# Altium footprint library AltiumLibraries.PcbLib: 247 footprints (part 6 of 16)
Each footprint in its own frame and in the unit in brackets; x right, y up, seen from the top. Pads: shape width x height; smd on the part's side, far side on the other; paste and mask are expansions set on the pad; w line width, h text height; cw(c..) or ccw(c..) is an arc to the next point about the centre after c.
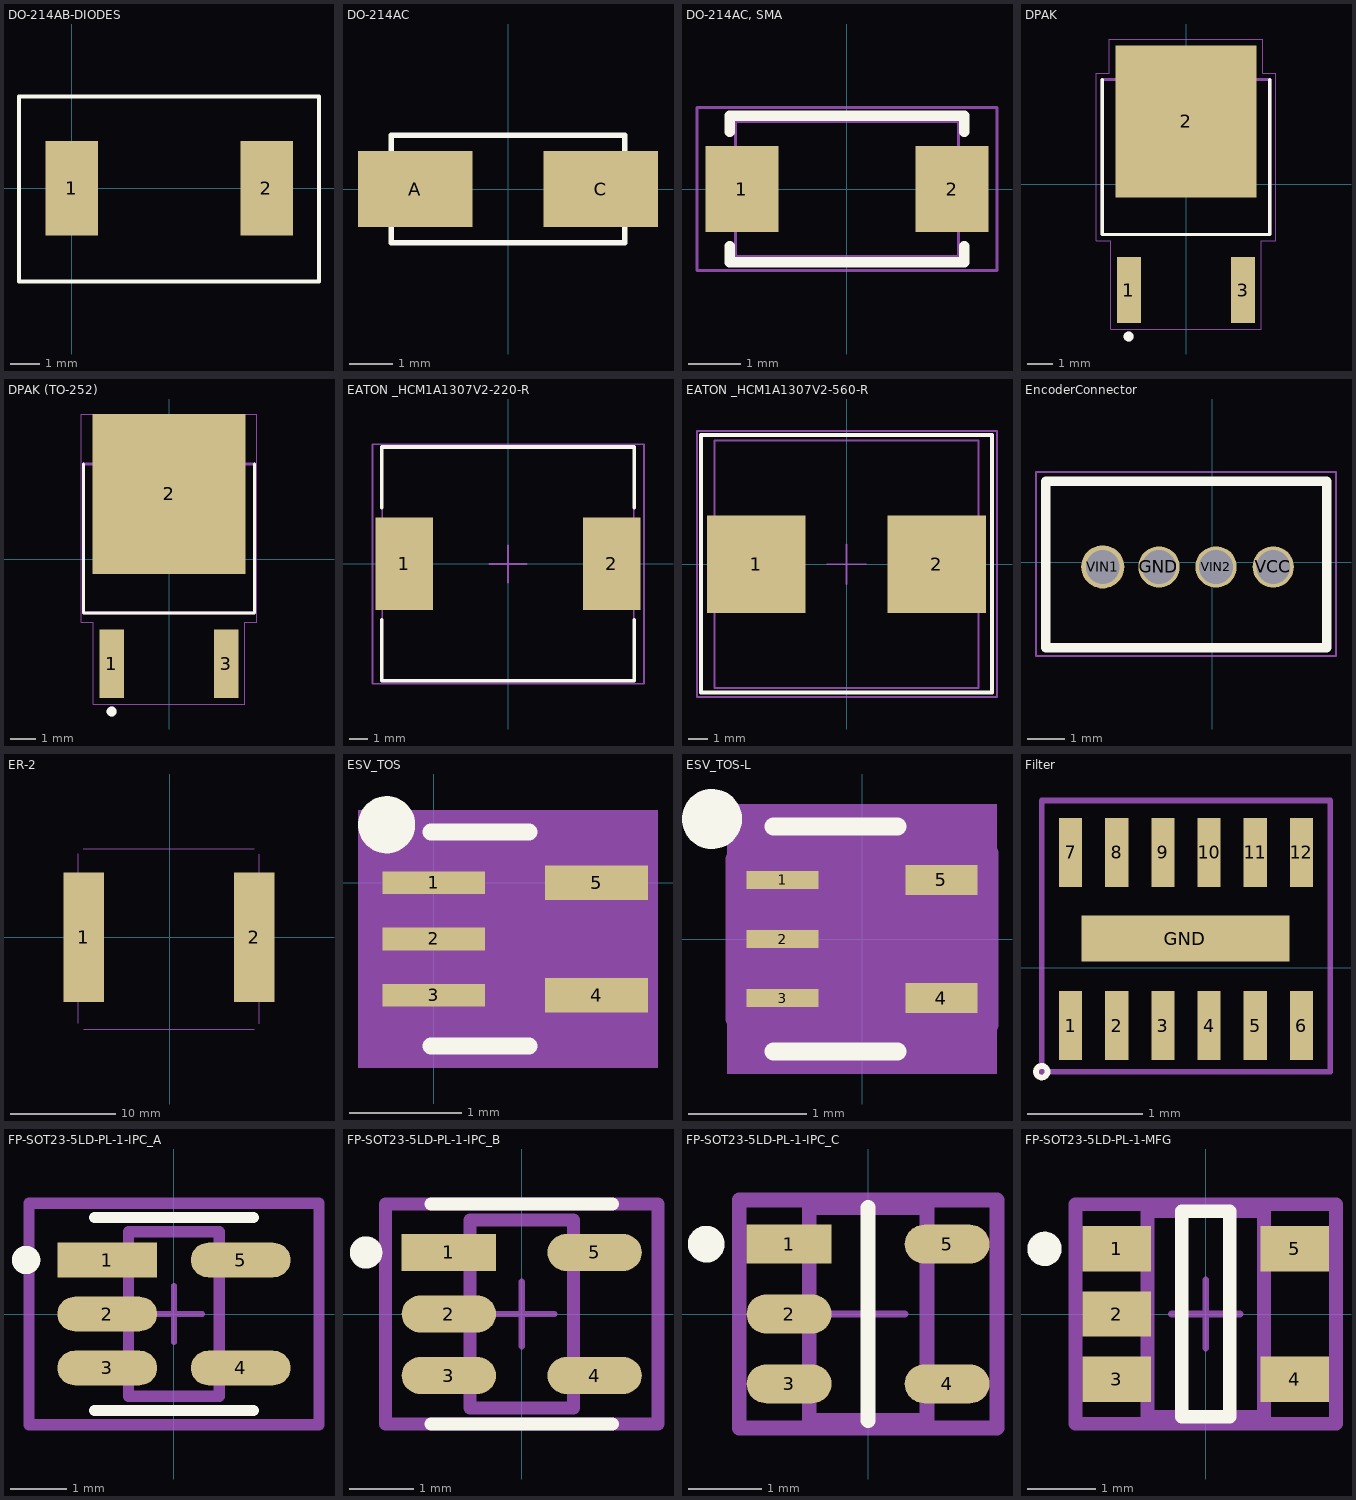
[diagram p5: the footprints below, top view; thin cyan lines are the x and y axes]

## DO-214AB-DIODES [mil]
pads (2):
  rect 70x125.98 smd: 1(0,0) 2(260,0)
Top Overlay:
  lines w5: -70,-124.48 30,-124.48 230,-124.48 330,-124.48 330,-97.98 330,122.52 -70,122.52 -70,-100.94 -70,-124.48
3D body "DO-214AB.SLDPRT": height 110.04, standoff -5.41, extent -28.54,-124.02 288.39,122.05

## DO-214AC [mm]
pads (2):
  rect 2.65x1.75 smd: A(-2.15,0) C(2.15,0)
Top Overlay:
  lines w0.127: -2.7,-1.25 2.7,-1.25 2.7,1.25 -2.7,1.25 -2.7,-1.25

## DO-214AC, SMA [mm]
pads (2):
  rect 1.4x1.64 smd: 1(-2.015,0) 2(2.015,0)
Top Overlay:
  lines w0.2: -2.25,-1.1 -2.25,-1.4 2.25,-1.4 2.25,-1.1 ; -2.25,1.1 -2.25,1.4 2.25,1.4 2.25,1.1
Mechanical 13:
  lines w0.05: -2.138,-1.288 2.138,-1.288 2.138,1.288 -2.138,1.288 -2.138,-1.288
Mechanical 15:
  lines w0.05: -2.875,-1.563 2.875,-1.563 2.875,1.563 -2.875,1.563 -2.875,-1.563
3D body "DIOM4326X23N.step": height 2.3, standoff 0, extent -2.36,-1.29 2.36,1.29

## DPAK [mm]
pads (3):
  rect 0.95x2.64 smd: 1(-2.286,-4.24) 3(2.286,-4.24)
  rect 5.63x6.09 smd: 2(0,2.51)
Top Overlay:
  circle w0.2: c-2.3,-6.1 r0.1
  lines w0.127: -3.35,4.185 -3.35,-2.015 3.35,-2.015 3.35,4.185
Bottom Overlay:
  lines w0.127: 3.35,-2.015 3.35,4.185
Top Paste:
  region: 1.225,3.24 2.535,3.24 2.535,1.78 1.225,1.78
  region: 1.225,5.27 2.535,5.27 2.535,3.81 1.225,3.81
  region: 1.225,1.21 2.535,1.21 2.535,-0.25 1.225,-0.25
  region: -2.535,1.21 -1.225,1.21 -1.225,-0.25 -2.535,-0.25
  region: -2.535,3.24 -1.225,3.24 -1.225,1.78 -2.535,1.78
  region: -2.535,5.27 -1.225,5.27 -1.225,3.81 -2.535,3.81
  region: -0.655,1.21 0.655,1.21 0.655,-0.25 -0.655,-0.25
  region: -0.655,5.27 0.655,5.27 0.655,3.81 -0.655,3.81
  region: -0.655,3.24 0.655,3.24 0.655,1.78 -0.655,1.78
Mechanical 4:
  circle w0.2: c-2.3,-6.1 r0.1
  circle w0.2: c-2.3,-6.1 r0.1
  lines w0.127: -3.35,-2.015 -3.35,4.185 ; -3.35,-2.015 3.35,-2.015 ; -3.35,-2.015 -3.35,4.185 ; -3.35,-2.015 3.35,-2.015 ; -3.35,4.185 3.35,4.185 ; -3.35,4.185 3.35,4.185 ; 3.35,-2.015 3.35,4.185 ; 3.35,-2.015 3.35,4.185
Mechanical 15:
  lines w0.05: -3.6,-2.27 -3.02,-2.27 -3.02,-5.81 3.02,-5.81 3.02,-2.27 3.6,-2.27 3.6,4.44 3.065,4.44 3.065,5.81 -3.065,5.81 -3.065,4.44 -3.6,4.44 -3.6,-2.27

## DPAK (TO-252) [mm]
pads (3):
  rect 0.98x2.74 smd: 1(-2.286,-4.191) 3(2.286,-4.191)
  rect 6.138x6.4 smd paste-4: 2(0,2.616)
Top Overlay:
  circle w0.2: c-2.3,-6.1 r0.1
  lines w0.127: -3.429,3.81 -3.429,-2.159 3.429,-2.159 3.429,3.81
Top Paste:
  region: -0.53,3.15 -2.29,3.15 -2.29,5.03 -0.53,5.03
  region: 2.29,3.15 0.53,3.15 0.53,5.03 2.29,5.03
  region: -0.53,0.21 -2.29,0.21 -2.29,2.09 -0.53,2.09
  region: 2.29,0.21 0.53,0.21 0.53,2.09 2.29,2.09
Mechanical 13:
  circle w0.2: c-2.3,-6.1 r0.1
  lines w0.127: -3.429,3.81 3.429,3.81 ; -3.429,3.825 -3.429,-2.159 3.429,-2.159 3.429,3.825
Mechanical 15:
  lines w0.05: -3.52,-2.52 -3.52,5.8 3.52,5.8 3.52,-2.52 3.026,-2.52 3.026,-5.8 -3.026,-5.8 -3.026,-2.52 -3.52,-2.52
3D body "DPAK.STEP": height 2.46, standoff -0.05, extent -3.25,-4.711 3.25,5.195

## EATON _HCM1A1307V2-220-R [mm] "FIXED IND 22UH 6A 33.1 mOHM SMD"
pads (2):
  rect 3.1x4.95 smd: 1(-5.55,0) 2(5.55,0)
Top Layer:
  lines w0.254: -4.6,-0.4 -4.6,0
Top Overlay:
  lines w0.2: -6.75,-3 -6.75,-6.25 6.75,-6.25 6.75,-3 ; -6.75,3 -6.75,6.25 6.75,6.25 6.75,3
Mechanical 13:
  lines w0.1: -6.73,-6.3 -6.73,6.3 6.73,6.3 6.73,-6.3 -6.73,-6.3
Mechanical 15:
  lines w0.1: -1,0 1,0 ; 0,-1 0,1 ; -7.25,-6.409 -7.25,6.401 7.267,6.401 7.267,-6.409 -7.25,-6.409
3D body "HCM1A1307V2-560-R.STEP": height 6.4, standoff -0.1, extent -6.725,-6.3 6.725,6.3

## EATON _HCM1A1307V2-560-R [mm] "FIXED IND 56UH 4A 65 mOHM SMD"
pads (2):
  rect 5x4.95 smd: 1(-4.6,0) 2(4.6,0)
Top Layer:
  lines w0.254: -4.6,-0.4 -4.6,0
Top Overlay:
  lines w0.2: -7.417,-6.528 -7.417,6.579 7.417,6.579 7.417,-6.528 -7.417,-6.528
Mechanical 13:
  lines w0.1: -6.73,-6.3 -6.73,6.3 6.73,6.3 6.73,-6.3 -6.73,-6.3
Mechanical 15:
  lines w0.1: -1,0 1,0 ; 0,-1 0,1 ; -7.62,-6.756 -7.62,6.782 7.671,6.782 7.671,-6.756 -7.62,-6.756
3D body "HCM1A1307V2-560-R.STEP": height 6.4, standoff -0.1, extent -6.725,-6.3 6.725,6.3

## EncoderConnector [mm] "CONN HEADER R/A 4POS 1.5MM"
pads (4):
  round 1.1 hole 0.9: GND(-1.421,-0.127) VCC(1.627,-0.127) VIN2(0.103,-0.127)
  round 1.15 hole 0.9: VIN1(-2.921,-0.127)
Top Overlay:
  lines w0.254: 3.048,-2.286 3.048,2.159 ; 3.055,-2.286 -4.445,-2.286 -4.445,2.159 3.055,2.159
Mechanical 15:
  lines w0.05: -4.7,-2.5 -4.7,2.4 3.3,2.4 3.3,-2.5 -4.7,-2.5

## ER-2 [mm]
pads (2):
  rect 3.825x12.32 smd: 1(-8.182,0.006) 2(8.071,0.007)
Mechanical 13:
  lines w0: -8.719,-8.203 -8.719,-5.113 -8.718,-5.113 -8.718,7.925 ; -8.217,8.398 8.052,8.398 8.052,8.397 8.066,8.397 ; -8.174,-8.748 8.052,-8.748 ; 8.563,-8.237 8.563,7.9

## ESV_TOS [mil]
pads (5):
  rect 36x8 smd paste+0 mask+0: 1(0,0) 2(0,-19.68) 3(0,-39.37)
  rect 36x12 smd paste+0 mask+0: 4(57,-39.37) 5(57,0)
Top Overlay:
  circle w10: c-16.5,20.32 r5
  lines w6: -1,-57.19 33.34,-57.19 ; -1,17.82 33.34,17.82
Mechanical 5:
  region: 78.5,-64.69 78.5,25.32 -26.5,25.32 -26.5,-64.69
Mechanical 13:
  lines w1: -4,-44.37 -4,-34.37 4,-34.37 4,-44.37 -4,-44.37 ; -4,-24.68 -4,-14.69 4,-14.69 4,-24.68 -4,-24.68 ; -4,-5 -4,5 4,5 4,-5 -4,-5 ; 4,-52.19 53,-52.19 53,12.81 4,12.81 4,-52.19 ; 53,-44.37 53,-34.37 61,-34.37 61,-44.37 53,-44.37 ; 53,-5 53,5 61,5 61,-5 53,-5
  text "*" at 1.5,-26 h50
Mechanical 15:
  region: 63,-62.19 -6,-62.19 -6,-53.37 -21.5,-53.37 -21.5,14 -6,14 -6,22.82 63,22.82 63,16 73.5,16 73.5,-55.37 63,-55.37
  lines w6: -21.5,-53.37 -21.5,14 -6,14 -6,16 63,16 73.5,16 73.5,-55.37 63,-55.37 -6,-55.37 -6,-53.37 -21.5,-53.37
3D body "ESV_TOS.step": height 24.09, standoff 0, extent -4.02,-52.2 61.02,12.83

## ESV_TOS-L [mil]
pads (5):
  rect 24x6 smd paste+0 mask+0: 1(-26.5,19.68) 2(-26.5,0) 3(-26.5,-19.68)
  rect 24x10 smd paste+0 mask+0: 4(26.5,-19.68) 5(26.5,19.68)
Top Overlay:
  circle w10: c-50,40 r5
  lines w6: -29.5,-37.5 11.78,-37.5 ; -29.5,37.5 11.78,37.5
Mechanical 5:
  region: 45,-45 45,45 -45,45 -45,-45
Mechanical 13:
  lines w1: -32.5,-24.68 -32.5,-14.69 -24.5,-14.69 -24.5,-24.68 -32.5,-24.68 ; -32.5,-5 -32.5,5 -24.5,5 -24.5,-5 -32.5,-5 ; -32.5,14.69 -32.5,24.68 -24.5,24.68 -24.5,14.69 -32.5,14.69 ; -24.5,-32.5 24.5,-32.5 24.5,32.5 -24.5,32.5 -24.5,-32.5 ; 24.5,-24.68 24.5,-14.69 32.5,-14.69 32.5,-24.68 24.5,-24.68 ; 24.5,14.69 24.5,24.68 32.5,24.68 32.5,14.69 24.5,14.69
  text "*" at -27,-7.32 h50
Mechanical 15:
  region: 28.5,-36.5 -28.5,-36.5 -28.5,-26.68 -42.5,-26.68 -42.5,26.68 -28.5,26.68 -28.5,36.5 28.5,36.5 28.5,28.68 42.5,28.68 42.5,-28.68 28.5,-28.68
  lines w6: -42.5,-26.68 -28.5,-26.68 -28.5,-36.5 28.5,-36.5 28.5,-28.68 42.5,-28.68 42.5,28.68 28.5,28.68 28.5,36.5 -28.5,36.5 -28.5,26.68 -42.5,26.68 -42.5,-26.68
3D body "ESV_TOS.step": height 24.09, standoff 0, extent -32.52,-32.52 32.52,32.52

## Filter [mm]
pads (13):
  rect 0.2x0.6 smd mask+0.05: 1(-2.9,-0.5) 2(-2.5,-0.5) 3(-2.1,-0.5) 4(-1.7,-0.5) 5(-1.3,-0.5) 6(-0.9,-0.5) 7(-2.9,1) 8(-2.5,1) 9(-2.1,1) 10(-1.7,1) 11(-1.3,1) 12(-0.9,1)
  rect 1.8x0.4 smd: GND(-1.905,0.254)
Top Overlay:
  circle w0.05: c-3.15,-0.9 r0.05
Mechanical 1:
  lines w0.05: -3.15,0.25 -3.15,1.45 -0.65,1.45 -0.65,0.25 ; -3.15,0.3 -3.15,-0.9 -0.65,-0.9 -0.65,0.3

## FP-SOT23-5LD-PL-1-IPC_A [mm]
pads (5):
  rect 1.756x0.61 smd paste+0 mask+0: 1(-1.175,0.95)
  rrect100% 1.756x0.61 smd paste+0 mask+0: 2(-1.175,0) 3(-1.175,-0.95) 4(1.175,-0.95) 5(1.175,0.95)
Top Overlay:
  circle w0.25: c-2.603,0.95 r0.125
  lines w0.2: -1.4,-1.7 1.4,-1.7 ; -1.4,1.7 1.4,1.7
Mechanical 5:
  lines w0.2: -2.553,-1.95 -2.553,1.95 2.553,1.95 2.553,-1.95 -2.553,-1.95
  text ".Designator" at -2.565,2.296 h1
Mechanical 13:
  lines w0.2: -0.8,-1.45 -0.8,1.45 0.8,1.45 0.8,-1.45 -0.8,-1.45
Mechanical 15:
  lines w0.2: -2.553,-1.95 -2.553,1.95 2.553,1.95 2.553,-1.95 -2.553,-1.95
Mechanical 16:
  lines w0.1: -0.5,0 0.5,0 ; 0,-0.5 0,0.5
3D body "IC_Microchip_MIC7300YM5-TR_eec.STEP": height 0.25, standoff 0, extent -2.553,-1.95 2.553,1.95

## FP-SOT23-5LD-PL-1-IPC_B [mm]
pads (5):
  rect 1.456x0.57 smd paste+0 mask+0: 1(-1.125,0.95)
  rrect100% 1.456x0.57 smd paste+0 mask+0: 2(-1.125,0) 3(-1.125,-0.95) 4(1.125,-0.95) 5(1.125,0.95)
Top Overlay:
  circle w0.25: c-2.403,0.95 r0.125
  lines w0.2: -1.4,-1.7 1.4,-1.7 ; -1.4,1.7 1.4,1.7
Mechanical 5:
  lines w0.2: -2.103,-1.7 -2.103,1.7 2.103,1.7 2.103,-1.7 -2.103,-1.7
  text ".Designator" at -2.184,2.017 h1
Mechanical 13:
  lines w0.2: -0.8,-1.45 -0.8,1.45 0.8,1.45 0.8,-1.45 -0.8,-1.45
Mechanical 15:
  lines w0.2: -2.103,-1.7 -2.103,1.7 2.103,1.7 2.103,-1.7 -2.103,-1.7
Mechanical 16:
  lines w0.1: -0.5,0 0.5,0 ; 0,-0.5 0,0.5
3D body "IC_Microchip_MIC7300YM5-TR_eec.STEP": height 0.25, standoff 0, extent -2.103,-1.7 2.103,1.7

## FP-SOT23-5LD-PL-1-IPC_C [mm]
pads (5):
  rect 1.156x0.53 smd paste+0 mask+0: 1(-1.075,0.95)
  rrect100% 1.156x0.53 smd paste+0 mask+0: 2(-1.075,0) 3(-1.075,-0.95) 4(1.075,-0.95) 5(1.075,0.95)
Top Overlay:
  circle w0.25: c-2.203,0.95 r0.125
  lines w0.2: -0.003,-1.45 0.003,-1.45 0.003,1.45 -0.003,1.45 -0.003,-1.45
Mechanical 5:
  lines w0.2: -1.753,-1.55 -1.753,1.55 1.753,1.55 1.753,-1.55 -1.753,-1.55
  text ".Designator" at -1.854,1.89 h1
Mechanical 13:
  lines w0.2: -0.8,-1.45 -0.8,1.45 0.8,1.45 0.8,-1.45 -0.8,-1.45
Mechanical 15:
  lines w0.2: -1.753,-1.55 -1.753,1.55 1.753,1.55 1.753,-1.55 -1.753,-1.55
Mechanical 16:
  lines w0.1: -0.5,0 0.5,0 ; 0,-0.5 0,0.5
3D body "IC_Microchip_MIC7300YM5-TR_eec.STEP": height 0.25, standoff 0, extent -1.753,-1.55 1.753,1.55

## FP-SOT23-5LD-PL-1-MFG [mm]
pads (5):
  rect 1x0.66 smd paste+0 mask+0: 1(-1.3,0.95) 2(-1.3,0) 3(-1.3,-0.95) 4(1.3,-0.95) 5(1.3,0.95)
Top Overlay:
  circle w0.25: c-2.35,0.95 r0.125
  lines w0.2: -0.35,-1.5 0.35,-1.5 0.35,1.5 -0.35,1.5 -0.35,-1.5
Mechanical 5:
  lines w0.2: -1.9,-1.6 1.9,-1.6 1.9,1.6 -1.9,1.6 -1.9,-1.6
  text ".Designator" at -2.007,1.941 h1
Mechanical 13:
  lines w0.2: -0.85,-1.5 0.85,-1.5 0.85,1.5 -0.85,1.5 -0.85,-1.5
Mechanical 15:
  lines w0.2: -1.9,-1.6 1.9,-1.6 1.9,1.6 -1.9,1.6 -1.9,-1.6
Mechanical 16:
  lines w0.1: -0.5,0 0.5,0 ; 0,-0.5 0,0.5
3D body "IC_Microchip_MIC7300YM5-TR_eec.STEP": height 0.25, standoff 0, extent -1.9,-1.6 1.9,1.6